# Altium footprint library 8-Crystals.PcbLib: 104 footprints (part 4 of 7)
Each footprint in its own frame and in the unit in brackets; x right, y up, seen from the top. Pads: shape width x height; smd on the part's side, far side on the other; paste and mask are expansions set on the pad; w line width, h text height; cw(c..) or ccw(c..) is an arc to the next point about the centre after c.
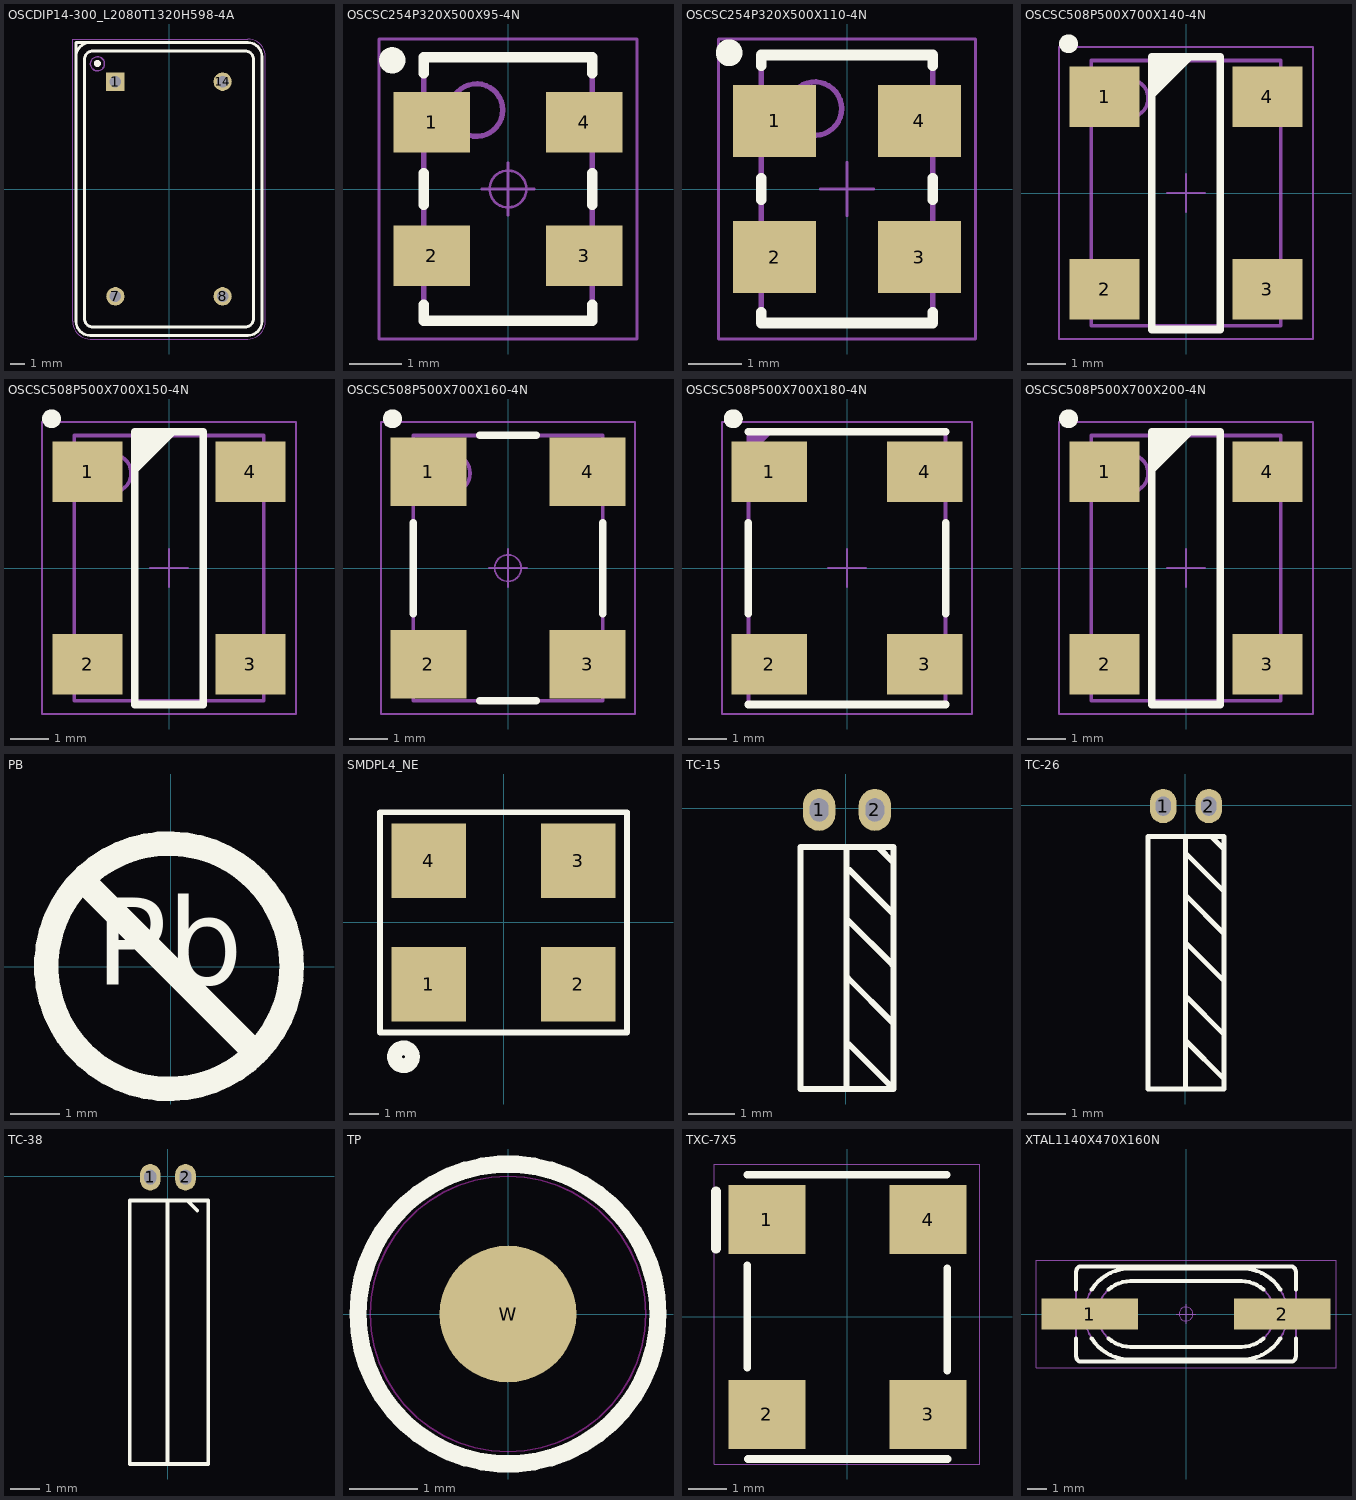
[diagram p3: the footprints below, top view; thin cyan lines are the x and y axes]

## OSCDIP14-300_L2080T1320H598-4A [mm] "Oscillator DIP 14 Leads, Row Spacing 7.62 mm; Pitch 2.54mm"
height 5.98
pads (4):
  rect 1.3x1.3 hole 0.8: 1(-3.81,7.62)
  round 1.3 hole 0.8: 7(-3.81,-7.62) 8(3.81,-7.62) 14(3.81,7.62)
Top Overlay:
  circle w0.25: c-5.081,8.911 r0.125
  lines w0.2: -6.6,9.4 cw(c-5.6,9.4) -5.6,10.4 ; -6.6,-9.4 ccw(c-5.6,-9.4) -5.6,-10.4 5.6,-10.4 ccw(c5.6,-9.4) 6.6,-9.4 6.6,9.4 ccw(c5.6,9.4) 5.6,10.4 -6.6,10.4 -6.6,-9.4 ; -6,-9.2 ccw(c-5.4,-9.2) -5.4,-9.8 5.4,-9.8 ccw(c5.4,-9.2) 6,-9.2 6,9.2 ccw(c5.4,9.2) 5.4,9.8 -5.4,9.8 ccw(c-5.4,9.2) -6,9.2 -6,-9.2
Mechanical 14:
  circle w0.1: c-5.08,8.89 r0.5
  lines w0.1: -6.6,9.4 cw(c-5.6,9.4) -5.6,10.4 ; -6.6,-9.4 ccw(c-5.6,-9.4) -5.6,-10.4 5.6,-10.4 ccw(c5.6,-9.4) 6.6,-9.4 6.6,9.4 ccw(c5.6,9.4) 5.6,10.4 -6.6,10.4 -6.6,-9.4 ; -6,-9.2 ccw(c-5.4,-9.2) -5.4,-9.8 5.4,-9.8 ccw(c5.4,-9.2) 6,-9.2 6,9.2 ccw(c5.4,9.2) 5.4,9.8 -5.4,9.8 ccw(c-5.4,9.2) -6,9.2 -6,-9.2
Mechanical 15:
  lines w0.05: -6.85,-9.4 ccw(c-5.6,-9.4) -5.6,-10.65 5.6,-10.65 ccw(c5.6,-9.4) 6.85,-9.4 6.85,9.4 ccw(c5.6,9.4) 5.6,10.65 -6.85,10.65 -6.85,-9.4
3D body "OSCDIP14-300_L2080T1320H598-4A.stp": height 5.98, standoff -3.6, extent -6.6,-10.4 6.6,10.4

## OSCSC254P320X500X95-4N [mm] "Oscillator, side concave; 2.54mm pitch; 4 pin, 3.20mm L X 5.00mm W X 1.10mm H, IPC Medium Density"
height 0.95
pads (4):
  rect 1.45x1.15 smd: 1(-1.45,1.27) 2(-1.45,-1.27) 3(1.45,-1.27) 4(1.45,1.27)
Top Overlay:
  circle w0.25: c-2.2,2.445 r0.125
  lines w0.2: -1.6,-2.2 -1.6,-2.5 1.6,-2.5 1.6,-2.2 ; -1.6,-0.3 -1.6,0.3 ; -1.6,2.2 -1.6,2.5 1.6,2.5 1.6,2.2 ; 1.6,-0.3 1.6,0.3
Mechanical 14:
  circle w0.1: c-0.6,1.5 r0.5
  lines w0.1: -1.6,-2.5 -1.6,2.5 1.6,2.5 1.6,-2.5 -1.6,-2.5
Mechanical 15:
  circle w0.05: c0,0 r0.35
  lines w0.05: -0.5,0 0.5,0 ; 0,-0.5 0,0.5 ; -2.45,-2.85 -2.45,2.85 2.45,2.85 2.45,-2.85 -2.45,-2.85
3D body "p145-115.stp": height 0.02, standoff 0, extent 0.725,0.695 2.175,1.845
3D body "p145-115.stp": height 0.02, standoff 0, extent 0.725,-1.845 2.175,-0.695
3D body "p145-115.stp": height 0.02, standoff 0, extent -2.175,-1.845 -0.725,-0.695
3D body "p145-115.stp": height 0.02, standoff 0, extent -2.175,0.695 -0.725,1.845
3D body "OSCSC254P320X500X110-4N.stp": height 1, standoff 0, extent -1.7,-2.6 1.7,2.6

## OSCSC254P320X500X110-4N [mm] "Oscillator, side concave; 2.54mm pitch; 4 pin, 3.20mm L X 5.00mm W X 1.10mm H, IPC Medium Density"
height 1.1
pads (4):
  rect 1.55x1.35 smd: 1(-1.35,1.27) 2(-1.35,-1.27) 3(1.35,-1.27) 4(1.35,1.27)
Top Overlay:
  circle w0.25: c-2.2,2.545 r0.125
  lines w0.2: -1.6,-2.3 -1.6,-2.5 1.6,-2.5 1.6,-2.3 ; -1.6,-0.2 -1.6,0.2 ; -1.6,2.3 -1.6,2.5 1.6,2.5 1.6,2.3 ; 1.6,-0.2 1.6,0.2
Mechanical 14:
  circle w0.1: c-0.6,1.5 r0.5
  lines w0.1: -1.6,-2.5 1.6,-2.5 1.6,2.5 -1.6,2.5 -1.6,-2.5
Mechanical 15:
  lines w0.05: -0.5,0 0.5,0 ; 0,-0.5 0,0.5 ; -2.4,-2.8 2.4,-2.8 2.4,2.8 -2.4,2.8 -2.4,-2.8
3D body "OSCSC254P320X500X110-4N.stp": height 1, standoff 0, extent -1.7,-2.6 1.7,2.6
3D body "p145-135.stp": height 0.02, standoff 0, extent -2.125,0.595 -0.575,1.945
3D body "p145-135.stp": height 0.02, standoff 0, extent 0.575,0.595 2.125,1.945
3D body "p145-135.stp": height 0.02, standoff 0, extent -2.125,-1.945 -0.575,-0.595
3D body "p145-135.stp": height 0.02, standoff 0, extent 0.575,-1.945 2.125,-0.595

## OSCSC508P500X700X140-4N [mm] "Oscillator,side concave; 5.08mm pitch; 4 pin,5.00mm L X 7.00mm W X 1.40mm H, IPC Medium Density"
height 1.4
pads (4):
  rect 1.85x1.6 smd: 1(-2.15,2.54) 2(-2.15,-2.54) 3(2.15,-2.54) 4(2.15,2.54)
Top Overlay:
  circle w0.25: c-3.1,3.94 r0.125
  lines w0.2: -0.9,2.6 0.1,3.6 ; -0.9,2.8 -0.1,3.6 ; -0.9,3 -0.3,3.6 ; -0.9,3.2 -0.5,3.6 ; -0.9,3.4 -0.7,3.6 ; -0.9,-3.6 0.9,-3.6 0.9,3.6 -0.9,3.6 -0.9,-3.6
Mechanical 14:
  circle w0.1: c-1.5,2.5 r0.5
  lines w0.1: -2.5,-3.5 2.5,-3.5 2.5,3.5 -2.5,3.5 -2.5,-3.5
Mechanical 15:
  lines w0.05: -0.5,0 0.5,0 ; 0,-0.5 0,0.5 ; -3.35,-3.85 3.35,-3.85 3.35,3.85 -3.35,3.85 -3.35,-3.85
3D body "OSCSC508P500X700X140-4N.stp": height 1.4, standoff 0, extent -2.6,-3.6 2.6,3.6
3D body "p185-160.stp": height 0.02, standoff 0, extent -3.075,1.74 -1.225,3.34
3D body "p185-160.stp": height 0.02, standoff 0, extent 1.225,1.74 3.075,3.34
3D body "p185-160.stp": height 0.02, standoff 0, extent -3.075,-3.34 -1.225,-1.74
3D body "p185-160.stp": height 0.02, standoff 0, extent 1.225,-3.34 3.075,-1.74

## OSCSC508P500X700X150-4N [mm] "CFPS-72-73 Case, SMD Oscillator, side convave, 4 pins, 5.00x7.00mm"
height 1.5
pads (4):
  rect 1.85x1.6 smd: 1(-2.15,2.54) 2(-2.15,-2.54) 3(2.15,-2.54) 4(2.15,2.54)
Top Overlay:
  circle w0.25: c-3.1,3.94 r0.125
  lines w0.2: -0.9,2.6 0.1,3.6 ; -0.9,2.8 -0.1,3.6 ; -0.9,3 -0.3,3.6 ; -0.9,3.2 -0.5,3.6 ; -0.9,3.4 -0.7,3.6 ; -0.9,-3.6 0.9,-3.6 0.9,3.6 -0.9,3.6 -0.9,-3.6
Mechanical 14:
  circle w0.1: c-1.5,2.5 r0.5
  lines w0.1: -2.5,-3.5 -2.5,3.5 2.5,3.5 2.5,-3.5 -2.5,-3.5
Mechanical 15:
  lines w0.05: -0.5,0 0.5,0 ; 0,-0.5 0,0.5 ; -3.35,-3.85 -3.35,3.85 3.35,3.85 3.35,-3.85 -3.35,-3.85
3D body "OSCSC508P500X700X150-4N.stp": height 1.5, standoff 0, extent -2.6,-3.6 2.6,3.6
3D body "p185-160.stp": height 0.02, standoff 0, extent -3.075,1.74 -1.225,3.34
3D body "p185-160.stp": height 0.02, standoff 0, extent 1.225,1.74 3.075,3.34
3D body "p185-160.stp": height 0.02, standoff 0, extent -3.075,-3.34 -1.225,-1.74
3D body "p185-160.stp": height 0.02, standoff 0, extent 1.225,-3.34 3.075,-1.74

## OSCSC508P500X700X160-4N [mm] "SMD Oscillator, side convave, 4 pins, 5.00x7.00mm"
height 1.6
pads (4):
  rect 2x1.8 smd: 1(-2.1,2.54) 2(-2.1,-2.54) 3(2.1,-2.54) 4(2.1,2.54)
Top Overlay:
  circle w0.25: c-3.05,3.94 r0.125
  lines w0.2: -2.5,-1.2 -2.5,1.2 ; -0.75,-3.5 0.75,-3.5 ; -0.75,3.5 0.75,3.5 ; 2.5,-1.2 2.5,1.2
Mechanical 14:
  circle w0.1: c-1.5,2.5 r0.5
  lines w0.1: -2.5,-3.5 -2.5,3.5 2.5,3.5 2.5,-3.5 -2.5,-3.5
Mechanical 15:
  circle w0.05: c0,0 r0.35
  lines w0.05: -0.5,0 0.5,0 ; 0,-0.5 0,0.5 ; -3.35,-3.85 -3.35,3.85 3.35,3.85 3.35,-3.85 -3.35,-3.85
3D body "p200-180.stp": height 0.02, standoff 0, extent 1.1,-3.44 3.1,-1.64
3D body "p200-180.stp": height 0.02, standoff 0, extent -3.1,-3.44 -1.1,-1.64
3D body "p200-180.stp": height 0.02, standoff 0, extent 1.1,1.64 3.1,3.44
3D body "p200-180.stp": height 0.02, standoff 0, extent -3.1,1.64 -1.1,3.44
3D body "OSCSC508P500X700X160-4N.stp": height 1.6, standoff 0, extent -2.6,-3.6 2.6,3.6

## OSCSC508P500X700X180-4N [mm] "SMD Oscillator, side convave, 4 pins, 5.00x7.00mm"
height 1.8
pads (4):
  rect 2x1.6 smd: 1(-2.05,2.54) 2(-2.05,-2.54) 3(2.05,-2.54) 4(2.05,2.54)
Top Overlay:
  circle w0.25: c-3,3.94 r0.125
  lines w0.2: -2.6,-3.6 2.6,-3.6 ; -2.6,-1.2 -2.6,1.2 ; -2.6,3.6 2.6,3.6 ; 2.6,-1.2 2.6,1.2
Mechanical 14:
  lines w0.1: -2.6,3 -2,3.6 ; -2.6,3.1 -2.1,3.6 ; -2.6,3.2 -2.2,3.6 ; -2.6,3.3 -2.3,3.6 ; -2.6,3.4 -2.4,3.6 ; -2.6,3.5 -2.5,3.6 ; -2.6,-3.6 2.6,-3.6 2.6,3.6 -2.6,3.6 -2.6,-3.6
Mechanical 15:
  lines w0.05: -0.5,0 0.5,0 ; 0,-0.5 0,0.5 ; -3.3,-3.85 -3.3,3.85 3.3,3.85 3.3,-3.85 -3.3,-3.85
3D body "p200-160.stp": height 0.02, standoff 0, extent 1.05,-3.34 3.05,-1.74
3D body "p200-160.stp": height 0.02, standoff 0, extent 1.05,1.74 3.05,3.34
3D body "p200-160.stp": height 0.02, standoff 0, extent -3.05,1.74 -1.05,3.34
3D body "p200-160.stp": height 0.02, standoff 0, extent -3.05,-3.34 -1.05,-1.74
3D body "OSCSC508P500X700X180-4N.stp": height 1.8, standoff 0, extent -2.6,-3.6 2.6,3.6

## OSCSC508P500X700X200-4N [mm] "CFPT Case, SMD Oscillator, side convave, 4 pins, 5.00x7.00mm"
height 2
pads (4):
  rect 1.85x1.6 smd: 1(-2.15,2.54) 2(-2.15,-2.54) 3(2.15,-2.54) 4(2.15,2.54)
Top Overlay:
  circle w0.25: c-3.1,3.94 r0.125
  lines w0.2: -0.9,2.6 0.1,3.6 ; -0.9,2.8 -0.1,3.6 ; -0.9,3 -0.3,3.6 ; -0.9,3.2 -0.5,3.6 ; -0.9,3.4 -0.7,3.6 ; -0.9,-3.6 -0.9,3.6 0.9,3.6 0.9,-3.6 -0.9,-3.6
Mechanical 14:
  circle w0.1: c-1.5,2.5 r0.5
  lines w0.1: -2.5,-3.5 2.5,-3.5 2.5,3.5 -2.5,3.5 -2.5,-3.5
Mechanical 15:
  lines w0.05: -0.5,0 0.5,0 ; 0,-0.5 0,0.5 ; -3.35,-3.85 3.35,-3.85 3.35,3.85 -3.35,3.85 -3.35,-3.85
3D body "OSCSC508P500X700X200-4N.stp": height 2, standoff 0, extent -2.6,-3.6 2.6,3.6
3D body "p185-160.stp": height 0.02, standoff 0, extent -3.084,-3.34 -1.234,-1.74
3D body "p185-160.stp": height 0.02, standoff 0, extent -3.084,1.74 -1.234,3.34
3D body "p185-160.stp": height 0.02, standoff 0, extent 1.216,1.74 3.066,3.34
3D body "p185-160.stp": height 0.02, standoff 0, extent 1.216,-3.34 3.066,-1.74

## PB [mm]
Top Overlay:
  circle w0.5: c-0.031,0.013 r2.5
  lines w0.5: -1.737,1.719 1.675,-1.693
  text "Pb" at -1.536,-0.948 h3.05
3D body "pb.stp": height 0.02, standoff 0, extent -2.725,-2.725 2.725,2.725

## SMDPL4_NE [mm]
height 9.3
pads (4):
  rect 2.54x2.54 smd mask+0.07: 1(-2.54,-2.1) 2(2.54,-2.1) 4(-2.54,2.1)
  rect 2.54x2.54 smd: 3(2.54,2.1)
Top Overlay:
  circle w0.5: c-3.404,-4.572 r0.306
  lines w0.2: -4.2,-3.75 4.2,-3.75 4.2,3.75 -4.2,3.75 -4.2,-3.75
3D body "2_54-2_54.stp": height 0.02, standoff 0, extent 1.27,-3.378 3.81,-0.838
3D body "2_54-2_54.stp": height 0.02, standoff 0, extent 1.27,0.838 3.81,3.378
3D body "2_54-2_54.stp": height 0.02, standoff 0, extent -3.81,-3.378 -1.27,-0.838
3D body "2_54-2_54.stp": height 0.02, standoff 0, extent -3.835,0.838 -1.295,3.378
3D body "y_7050-4.stp": height 1.6, standoff 0, extent -3.5,-2.475 3.5,2.526

## TC-15 [mm]
height 9.3
pads (2):
  oval 0.7x0.9 hole 0.4 slot 0.5 at 90 deg: 1(-0.575,-0.041) 2(0.625,-0.041)
Top Overlay:
  lines w0.127: 0.013,-6.045 0.013,-0.851 ; 0.041,-2.41 0.996,-3.365 ; 0.048,-3.658 1.02,-4.63 ; 0.059,-5.073 1.021,-6.035 ; 0.061,-1.32 1.019,-2.278 ; 0.695,-0.846 1.025,-1.176 ; -0.975,-6.045 1.025,-6.045 1.025,-0.837 -0.975,-0.837 -0.975,-6.045
3D body "tc-15.stp": height 1.5, standoff -2.25, extent -0.75,-5.893 0.75,0
3D body "v090-050.stp": height 0.02, standoff -1.65, extent -1.024,-0.49 -0.124,0.41
3D body "v090-050.stp": height 0.02, standoff -1.65, extent 0.176,-0.49 1.076,0.41

## TC-26 [mm]
height 9.3
pads (2):
  oval 0.7x0.9 hole 0.4 slot 0.5 at 90 deg: 1(-0.575,-0.029) 2(0.625,-0.029)
Top Overlay:
  lines w0.127: 0.013,-7.418 0.013,-0.839 ; 0.038,-6.218 0.999,-7.179 ; 0.041,-2.398 0.996,-3.353 ; 0.048,-3.646 1.02,-4.618 ; 0.059,-5.061 1.021,-6.023 ; 0.061,-1.308 1.019,-2.266 ; 0.695,-0.834 1.025,-1.164 ; -0.975,-7.468 -0.975,-0.825 1.025,-0.825 1.025,-7.468 -0.975,-7.468
3D body "tc-26.stp": height 2.1, standoff -2.45, extent -1.05,-7.418 1.05,0.012
3D body "v090-050.stp": height 0.02, standoff -1.65, extent -1.024,-0.479 -0.125,0.421
3D body "v090-050.stp": height 0.02, standoff -1.65, extent 0.176,-0.479 1.075,0.421

## TC-38 [mm]
height 9.3
pads (2):
  oval 0.7x0.9 hole 0.4 slot 0.5 at 90 deg: 1(-0.6,-0.029) 2(0.6,-0.029)
Top Overlay:
  lines w0.127: -0.012,-9.779 -0.012,-0.839 ; 0.67,-0.834 1,-1.164 ; -1.295,-9.804 1.372,-9.804 1.372,-0.825 -1.295,-0.825 -1.295,-9.804
3D body "v090-050.stp": height 0.02, standoff -1.65, extent 0.15,-0.479 1.05,0.421
3D body "v090-050.stp": height 0.02, standoff -1.65, extent -1.05,-0.479 -0.15,0.421
3D body "TC-38.stp": height 3.2, standoff -3.04, extent -1.575,-9.706 1.625,0.004

## TP [mm]
height 11.7
pads (1):
  round 2 smd mask+1: W(0,0)
Top Overlay:
  circle w0.254: c0,0 r2.195
Keep-Out Layer:
  circle w0.025: c0,0 r2.017
3D body "1_016-1_016-3_tp.stp": height 0.02, standoff 0, extent -1.5,-1.5 1.5,1.5

## TXC-7X5 [mm]
height 9.3
pads (4):
  rect 2.007x1.8 smd: 1(-2.1,2.54) 3(2.1,-2.54) 4(2.1,2.54)
  rect 2x1.8 smd: 2(-2.1,-2.54)
Top Overlay:
  lines w0.203: -2.616,-1.321 -2.616,1.346 ; -2.616,3.708 2.584,3.708 ; -2.591,-3.708 2.609,-3.708 ; 2.6,-1.397 2.6,1.27
  lines w0.254: -3.429,1.778 -3.429,3.277
Mechanical 7:
  text "3" at 1.651,-2.108 h0.64
  text "2" at -1.651,-2.083 h0.64
  text "4" at 1.651,2.565 h0.64
  text "1" at -1.651,2.591 h0.64
Mechanical 11:
  lines w0.025: -3.48,-3.835 -3.48,3.988 3.454,3.988 3.454,-3.835 -3.48,-3.835
3D body "p200-180.stp": height 0.02, standoff 0, extent 1.1,-3.44 3.1,-1.64
3D body "p200-180.stp": height 0.02, standoff 0, extent -3.1,-3.44 -1.1,-1.64
3D body "p200-180.stp": height 0.02, standoff 0, extent 1.1,1.64 3.1,3.44
3D body "p200-180.stp": height 0.02, standoff 0, extent -3.1,1.64 -1.1,3.44
3D body "txc-7x5-smd.stp": height 1.3, standoff 0, extent -2.5,-3.5 2.5,3.5

## XTAL1140X470X160N [mm] "HC/49US Crystal;11.40mm L X 4.70mm W X 1.60mm H"
height 1.6
pads (2):
  rect 4.85x1.55 smd: 1(-4.85,0) 2(4.85,0)
Top Overlay:
  lines w0.2: -5.525,-1.225 -5.525,-2.15 ccw(c-5.275,-2.15) -5.275,-2.4 5.275,-2.4 ccw(c5.275,-2.15) 5.525,-2.15 5.525,-1.225 ; -5.525,1.225 -5.525,2.15 cw(c-5.275,2.15) -5.275,2.4 5.275,2.4 cw(c5.275,2.15) 5.525,2.15 5.525,1.225 ; -4.747,-1.225 ccw(c-2.8,0) -2.8,-2.3 2.8,-2.3 ccw(c2.8,0) 4.747,-1.225 ; -4.747,1.225 cw(c-2.8,0) -2.8,2.3 2.8,2.3 cw(c2.8,0) 4.747,1.225 ; -3.905,-1.225 ccw(c-2.8,0) -2.8,-1.65 2.8,-1.65 ccw(c2.8,0) 3.905,-1.225 ; -3.905,1.225 cw(c-2.8,0) -2.8,1.65 2.8,1.65 cw(c2.8,0) 3.905,1.225
Mechanical 14:
  lines w0.1: -5.525,-2.15 ccw(c-5.275,-2.15) -5.275,-2.4 5.275,-2.4 ccw(c5.275,-2.15) 5.525,-2.15 5.525,2.15 ccw(c5.275,2.15) 5.275,2.4 -5.275,2.4 ccw(c-5.275,2.15) -5.525,2.15 -5.525,-2.15 ; -2.8,-2.3 cw(c-2.8,0) -2.8,2.3 2.8,2.3 cw(c2.8,0) 2.8,-2.3 -2.8,-2.3 ; -2.8,-1.65 cw(c-2.8,0) -2.8,1.65 2.8,1.65 cw(c2.8,0) 2.8,-1.65 -2.8,-1.65
Mechanical 15:
  circle w0.05: c0,0 r0.35
  lines w0.05: -0.5,0 0.5,0 ; 0,-0.5 0,0.5 ; -7.55,-2.7 7.55,-2.7 7.55,2.7 -7.55,2.7 -7.55,-2.7
3D body "p485-155.stp": height 0.02, standoff 0, extent 2.425,-0.775 7.275,0.775
3D body "p485-155.stp": height 0.02, standoff 0, extent -7.251,-0.775 -2.401,0.775
3D body "XTAL1105X470X160N.stp": height 1.6, standoff 0, extent -6.35,-2.4 6.35,2.4